# Altium footprint library Selex_PCBLib.PcbLib: 388 footprints (part 14 of 25)
Each footprint in its own frame and in the unit in brackets; x right, y up, seen from the top. Pads: shape width x height; smd on the part's side, far side on the other; paste and mask are expansions set on the pad; w line width, h text height; cw(c..) or ccw(c..) is an arc to the next point about the centre after c.
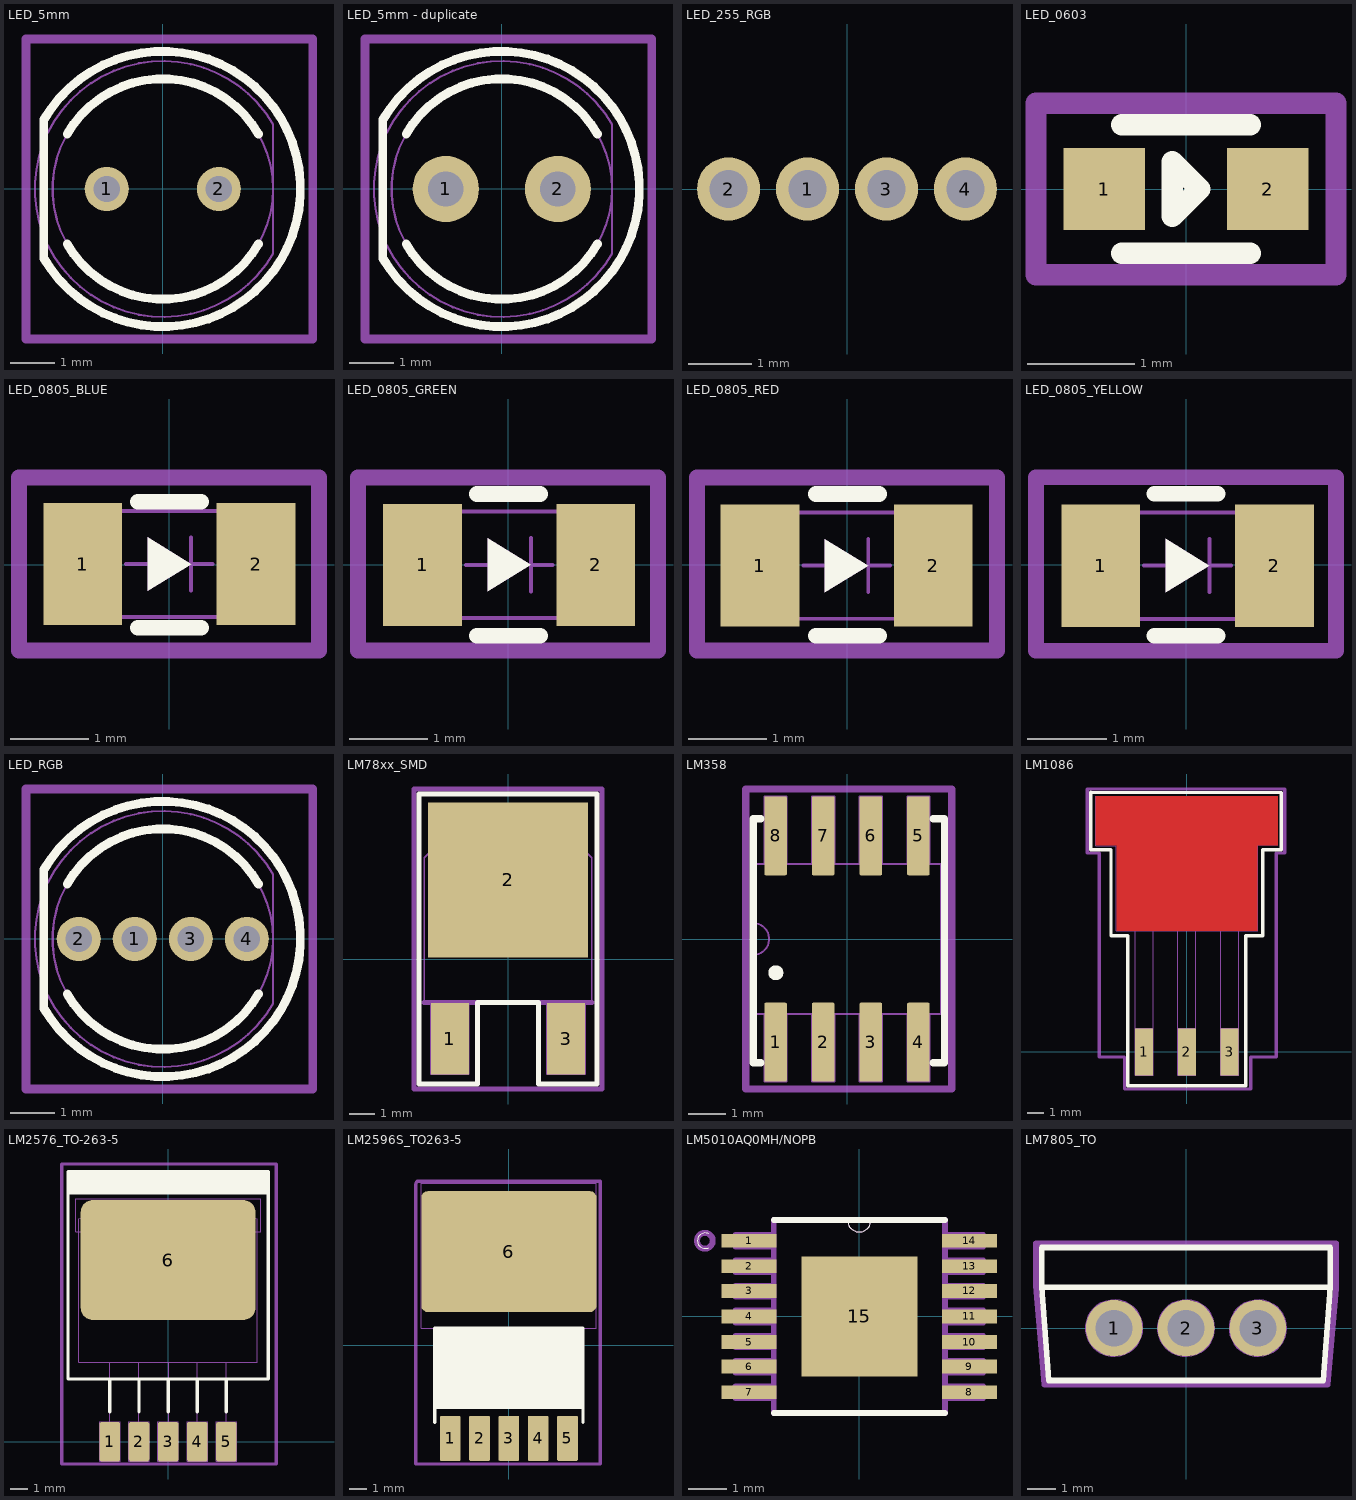
[diagram p13: the footprints below, top view; thin cyan lines are the x and y axes]

## LED_5mm [mm]
pads (2):
  round 1 hole 0.6: 1(-1.27,0) 2(1.27,0)
Top Overlay:
  lines w0.2: -2.7,-1.572 -2.7,1.572 ; -2.696,-1.57 ccw(c0,0) -2.696,1.57 ; -2.165,-1.25 ccw(c0,0) 2.165,-1.25 ; -2.165,1.25 cw(c0,0) 2.165,1.25
Mechanical 1:
  circle w0.05: c0,0 r2.5
  lines w0.05: 2.5,-1.47 cw(c0,0) 2.5,1.47 ; 2.5,-1.47 2.5,1.47
Mechanical 15:
  lines w0.2: -3.1,-3.4 -3.1,3.4 3.4,3.4 3.4,-3.4 -3.1,-3.4
3D body "ALSRobot-LED-RGB 5mm.step": height 9.85, standoff -2.85, extent -2.9,-2.9 2.5,2.9

## LED_5mm - duplicate [mm]
pads (2):
  round 1.5 hole 0.8: 1(-1.27,0) 2(1.27,0)
Top Overlay:
  lines w0.2: -2.7,-1.572 -2.7,1.572 ; -2.696,-1.57 ccw(c0,0) -2.696,1.57 ; -2.165,-1.25 ccw(c0,0) 2.165,-1.25 ; -2.165,1.25 cw(c0,0) 2.165,1.25
Mechanical 1:
  circle w0.05: c0,0 r2.5
  lines w0.05: 2.5,-1.47 cw(c0,0) 2.5,1.47 ; 2.5,-1.47 2.5,1.47
Mechanical 15:
  lines w0.2: -3.1,-3.4 3.4,-3.4 3.4,3.4 -3.1,3.4 -3.1,-3.4
3D body "ALSRobot-LED-RGB 5mm.step": height 9.85, standoff -2.85, extent -2.9,-2.9 2.5,2.9

## LED_255_RGB [mm]
pads (4):
  round 1 hole 0.6 mask+0.05: 1(-0.625,0) 2(-1.875,0) 3(0.625,0) 4(1.875,0)
Mechanical 1:
  text "R" at -2.01,-0.16 h0.3
  text "AN" at -0.93,-0.14 h0.3
  text "G" at 0.48,-0.13 h0.3
  text "B" at 1.77,-0.13 h0.3
3D body "ALSRobot-LED-RGB 5mm.sldprt": height 12.71, standoff 0.01, extent -2.5,-3 2.9,2.799

## LED_0603 [mil]
pads (2):
  rect 30x30 smd: 1(-30,0) 2(30,0)
Top Overlay:
  lines w7.87: -23.62,-23.62 23.62,-23.62 ; -23.62,23.62 23.62,23.62 ; -5,-10 -5,10 5,0 -5,-10
Mechanical 15:
  lines w7.87: -55.12,-31.5 55.12,-31.5 55.12,31.5 -55.12,31.5 -55.12,-31.5
3D body "User Library-LED_0603_R.STEP": height 23.62, standoff -0.08, extent -31.49,-15.74 31.5,15.75

## LED_0805_BLUE [mm]
pads (2):
  rect 1x1.55 smd mask+0.1: 1(-1.1,0.01) 2(1.1,0.01)
Top Overlay:
  region: -0.275,0.347 -0.275,-0.327 0.275,0.01
  lines w0.2: -0.4,-0.8 0.4,-0.8 ; -0.4,0.8 0.4,0.8
Mechanical 1:
  region: -0.275,0.347 -0.275,-0.327 0.275,0.01
  lines w0.05: -0.55,0.01 -0.275,0.01 ; 0.275,-0.327 0.275,0.347 ; 0.275,0.01 0.55,0.01 ; -1.1,-0.665 1.1,-0.665 1.1,0.685 -1.1,0.685 -1.1,-0.665
Mechanical 15:
  lines w0.2: -1.91,-1.09 1.9,-1.09 1.9,1.11 -1.91,1.11 -1.91,-1.09
3D body "LED0805BLUE.step": height 1.1, standoff 0, extent -0.96,-0.605 1.06,0.645

## LED_0805_GREEN [mm]
pads (2):
  rect 1x1.55 smd mask+0.1: 1(-1.09,0) 2(1.11,0)
Top Overlay:
  region: -0.265,0.338 -0.265,-0.337 0.285,0
  lines w0.2: -0.4,-0.9 0.4,-0.9 ; -0.4,0.9 0.4,0.9
Mechanical 1:
  region: -0.265,0.338 -0.265,-0.337 0.285,0
  lines w0.05: -0.54,0 -0.265,0 ; 0.285,-0.337 0.285,0.338 ; 0.285,0 0.56,0 ; -1.09,-0.675 1.11,-0.675 1.11,0.675 -1.09,0.675 -1.09,-0.675
Mechanical 15:
  lines w0.2: -1.91,-1.09 -1.91,1.11 1.9,1.11 1.9,-1.09 -1.91,-1.09
3D body "LED0805GREEN.step": height 1.1, standoff 0, extent -1.07,-0.625 0.95,0.625

## LED_0805_RED [mm]
pads (2):
  rect 1x1.55 smd mask+0.1: 1(-1.11,-0.01) 2(1.09,-0.01)
Top Overlay:
  region: -0.285,0.328 -0.285,-0.347 0.265,-0.01
  lines w0.2: -0.4,-0.9 0.4,-0.9 ; -0.4,0.9 0.4,0.9
Mechanical 1:
  region: -0.285,0.328 -0.285,-0.347 0.265,-0.01
  lines w0.05: -0.56,-0.01 -0.285,-0.01 ; 0.265,-0.347 0.265,0.328 ; 0.265,-0.01 0.54,-0.01 ; -1.11,-0.685 -1.11,0.665 1.09,0.665 1.09,-0.685 -1.11,-0.685
Mechanical 15:
  lines w0.2: -1.91,-1.09 1.9,-1.09 1.9,1.11 -1.91,1.11 -1.91,-1.09
3D body "LED0805RED.step": height 1.1, standoff 0, extent -1.05,-0.635 0.97,0.615

## LED_0805_YELLOW [mm]
pads (2):
  rect 1x1.55 smd mask+0.1: 1(-1.08,-0.01) 2(1.12,-0.01)
Top Overlay:
  region: -0.255,0.328 -0.255,-0.347 0.295,-0.01
  lines w0.2: -0.4,-0.9 0.4,-0.9 ; -0.4,0.9 0.4,0.9
Mechanical 1:
  region: -0.255,0.328 -0.255,-0.347 0.295,-0.01
  lines w0.05: -0.53,-0.01 -0.255,-0.01 ; 0.295,-0.347 0.295,0.328 ; 0.295,-0.01 0.57,-0.01 ; -1.08,-0.685 -1.08,0.665 1.12,0.665 1.12,-0.685 -1.08,-0.685
Mechanical 15:
  lines w0.2: -1.9,-1.09 -1.9,1.11 1.9,1.11 1.9,-1.09 -1.9,-1.09
3D body "LED0805YELLOW.step": height 1.1, standoff 0, extent -1,-0.635 1.02,0.615

## LED_RGB [mm]
pads (4):
  round 1 hole 0.6 unplated mask+0.05: 1(-0.635,0) 2(-1.905,0) 3(0.635,0) 4(1.905,0)
Top Overlay:
  lines w0.2: -2.7,-1.572 -2.7,1.572 ; -2.696,-1.57 ccw(c0,0) -2.696,1.57 ; -2.165,-1.25 ccw(c0,0) 2.165,-1.25 ; -2.165,1.25 cw(c0,0) 2.165,1.25
Mechanical 1:
  circle w0.05: c0,0 r2.5
  lines w0.05: 2.5,-1.47 cw(c0,0) 2.5,1.47 ; 2.5,-1.47 2.5,1.47
Mechanical 15:
  lines w0.2: -3.1,-3.4 3.4,-3.4 3.4,3.4 -3.1,3.4 -3.1,-3.4
3D body "ALSRobot-LED-RGB 5mm.step": height 9.85, standoff -2.85, extent -2.9,-2.9 2.5,2.9

## LM78xx_SMD [mm] "LM78xx Liner"
height 2.4
pads (3):
  rect 1.5x2.8 smd mask+0.1: 1(-2.286,-3.125) 3(2.286,-3.125)
  rect 6.3x6.1 smd mask+0.1: 2(0,3.125)
Top Overlay:
  lines w0.2: -3.5,-4.9 -3.5,6.5 3.5,6.5 3.5,-4.9 1.2,-4.9 1.2,-1.7 -1.2,-1.7 -1.2,-4.9 -3.5,-4.9
Mechanical 1:
  lines w0.05: -3.3,-1.7 -3.3,4 -2.8,4.5 2.8,4.5 3.3,4 3.3,-1.7 ; -3.04,-1.7 -3.04,-4.52 -1.54,-4.52 -1.54,-1.7 ; 1.52,-1.7 1.52,-4.52 3.04,-4.52 3.04,-1.7
  lines w0.2: -3.3,-1.7 3.3,-1.7
Mechanical 7:
  lines w0.2: -3.7,-5.1 3.7,-5.1 3.7,6.7 -3.7,6.7 -3.7,0.3 -3.7,-5.1
3D body "7805DPAK.step": height 2.3, standoff 0, extent -3.146,-3.85 3.347,5.65

## LM358 [mm] "LM358, SOP8"
height 1.75
pads (8):
  rrect10% 0.6x2.1 smd mask+0.07: 1(-1.905,-2.75) 2(-0.635,-2.75) 3(0.635,-2.75) 4(1.905,-2.75) 5(1.905,2.75) 6(0.635,2.75) 7(-0.635,2.75) 8(-1.905,2.75)
Top Overlay:
  circle w0.2: c-1.9,-0.9 r0.1
  lines w0.2: -2.3,-3.3 -2.5,-3.3 -2.5,3.2 -2.3,3.2 ; 2.3,-3.3 2.6,-3.3 2.6,3.2 2.3,3.2
Mechanical 1:
  lines w0.05: -2.205,-2 -2.205,-2.15 -2.205,-3.8 -1.605,-3.8 -1.605,-2 ; -2.205,2 -2.205,3.8 -1.605,3.8 -1.605,2.15 -1.605,2 ; -0.935,-2 -0.935,-2.15 -0.935,-3.8 -0.335,-3.8 -0.335,-2 ; -0.935,2 -0.935,3.8 -0.335,3.8 -0.335,2.15 -0.335,2 ; 0.335,-2 0.335,-2.15 0.335,-3.8 0.935,-3.8 0.935,-2 ; 0.335,2 0.335,3.8 0.935,3.8 0.935,2.15 0.935,2 ; 1.605,-2 1.605,-2.15 1.605,-3.8 2.205,-3.8 2.205,-2 ; 1.605,2 1.605,3.8 2.205,3.8 2.205,2.15 2.205,2 ; -2.5,-2 -2.5,-0.424 ccw(c-2.5,0) -2.5,0.424 -2.5,2 2.5,2 2.5,-2 -2.5,-2
  text "1" at -2,-1.4 h0.6
Mechanical 7:
  lines w0.2: -2.7,-4 -2.7,-1.4 -2.7,4 2.8,4 2.8,-4 -2.7,-4
3D body "User Library-HSOP8-1.STEP": height 1.74, standoff -0.01, extent -2.5,-3.1 2.5,3.1

## LM1086 [mm] "D2PAK"
height 4.64
pads (3):
  rect 1.07x2.78 smd: 1(-2.54,0) 2(0,0) 3(2.54,0)
Top Layer:
  region: -5.4,15.17 5.4,15.17 5.4,12.26 4.165,12.26 4.165,7.18 -4.165,7.18 -4.165,12.26 -5.4,12.26
Top Overlay:
  lines w0.2: -5.7,12 -4.5,12 -4.5,6.9 -3.5,6.9 -3.5,-2 3.5,-2 3.5,6.9 4.5,6.9 4.5,12 5.6,12 5.6,15.396 -5.7,15.403 -5.7,12
Mechanical 1:
  lines w0.05: -3.075,7.2 -3.075,1.39 ; -2.005,1.37 -2.005,7.18 ; -0.535,1.41 -0.535,7.2 ; 0.535,7.2 0.535,1.39 ; 2.005,1.41 2.005,7.2 ; 3.075,7.2 3.075,1.39 ; -3.075,1.39 -2.005,1.39 -2.005,-1.39 -3.075,-1.39 -3.075,1.39 ; 0.535,1.39 -0.535,1.39 -0.535,-1.39 0.535,-1.39 0.535,1.39 ; 3.075,1.39 2.005,1.39 2.005,-1.39 3.075,-1.39 3.075,1.39 ; -5.41,12.24 -4.2,12.24 -4.2,7.2 4.2,7.2 4.2,12.3 5.4,12.3 5.4,15.17 -5.41,15.17 -5.41,12.24
Mechanical 7:
  lines w0.2: -5.9,11.8 -5.9,15.6 5.8,15.6 5.8,11.8 5.3,11.8 5.3,-0.3 3.8,-0.3 3.8,-2.2 -3.7,-2.2 -3.7,-0.3 -5.2,-0.3 -5.2,11.5 -5.2,11.8 -5.9,11.8
3D body "LM1086.STEP": height 4.48, standoff -0.08, extent -5.06,-0.169 5.1,14.169

## LM2576_TO-263-5 [mm] "TO-263 -5  10.16x13.94, Pitch 1.7mm"
height 4.8
pads (6):
  rrect20% 1.2x2.3 smd paste+0 mask+0.05: 1(-3.4,0) 2(-1.7,0) 3(0,0) 4(1.7,0) 5(3.4,0)
  rrect20% 10.2x7 smd paste+0 mask+0.1: 6(0,10.6)
Top Overlay:
  rectangle: -5.842,14.433 5.842,15.748
  lines w0.2: -3.4,1.75 -3.4,3.66 ; -1.7,1.75 -1.7,3.66 ; 0,1.75 0,3.66 ; 1.7,1.75 1.7,3.66 ; 3.4,1.75 3.4,3.66 ; -5.842,3.66 -5.842,15.748 5.842,15.748 5.842,3.66 -5.842,3.66
Mechanical 1:
  lines w0.05: -3.4,1.15 -3.4,4.623 ; -1.7,1.15 -1.7,4.623 ; 0,1.15 0,4.623 ; 1.7,1.15 1.7,4.623 ; 3.4,1.15 3.4,4.623 ; -5.4,12.25 -5.4,14.17 5.4,14.17 5.4,12.25 5.205,12.25 4.15,12.25 4.15,7.2 -4.15,7.2 -4.15,12.25 -5.2,12.25 -5.4,12.25 ; -5.205,4.623 5.205,4.623 5.205,13.005 3.555,13.513 -3.555,13.513 -5.205,13.005 -5.205,11.863 -5.205,4.623 ; -4,-1.15 -2.8,-1.15 -2.8,1.15 -4,1.15 -4,-1.15 ; -2.3,-1.15 -2.3,1.15 -1.1,1.15 -1.1,-1.15 -2.3,-1.15 ; -0.6,-1.15 -0.6,1.15 0.6,1.15 0.6,-1.15 -0.6,-1.15 ; 1.1,-1.15 1.1,1.15 2.3,1.15 2.3,-1.15 1.1,-1.15 ; 2.8,-1.15 2.8,1.15 4,1.15 4,-1.15 2.8,-1.15
Mechanical 7:
  lines w0.2: -6.2,-1.3 -6.2,4 -6.2,16.2 6.3,16.2 6.3,-1.3 -6.2,-1.3
3D body "TO2635.STEP": height 4.56, standoff 0, extent -5.14,-0.357 5.02,13.658

## LM2596S_TO263-5 [mm] "TO263-5, SMD, 5V"
height 4.6
pads (6):
  rrect10% 1.2x2.6 smd mask+0.05: 1(-3.4,-5.415) 2(-1.7,-5.415) 3(0,-5.415) 4(1.7,-5.415) 5(3.4,-5.415)
  rrect10% 10.16x7 smd mask+0.05: 6(0,5.415)
Top Overlay:
  rectangle: -4.3,-3.625 4.3,0.97
  lines w0.2: -4.3,-4.49 -4.3,-3.625 4.3,-3.625 4.3,-4.49 ; -4.3,-3.825 -4.3,0.975 ; -4.3,0.97 4.3,0.97 4.3,-3.825
Mechanical 1:
  lines w0.05: -5.08,0.97 5.08,0.97 5.08,9.375 -5.08,9.375 -5.08,0.97
Mechanical 7:
  lines w0.2: -5.4,-6.9 5.3,-6.9 5.3,9.5 -5.3,9.5 ccw(c-5.059,9.259) -5.4,9.259 -5.4,-6.9
3D body "User Library-TO-263-1.step": height 4.65, standoff -0.18, extent -5.205,-5.914 5.205,8.455

## LM5010AQ0MH/NOPB [mil]
pads (15):
  rect 56x14 smd: 1(-112,77) 2(-112,51) 3(-112,26) 4(-112,0) 5(-112,-26) 6(-112,-51) 7(-112,-77) 8(112,-77) 9(112,-51) 10(112,-26) 11(112,0) 12(112,26) 13(112,51) 14(112,77)
  rect 118x122 smd: 15(0,0)
Top Overlay:
  lines w0: -153.06,69.97 cw(c-156.64,77) -153.06,84.03 ; -12,98 ccw(c0,98) 12,98
  lines w6: -87,-98 87,-98 ; -87,98 -12,98 12,98 87,98
Mechanical 13:
  lines w0: -12,98 ccw(c0,98) 12,98
  lines w6: -165,77 cw(c-157,77) -149,77 cw(c-157,77) -165,77 ; -126,-83 -87,-83 -87,-71 -126,-71 -126,-83 ; -126,-57 -87,-57 -87,-45 -126,-45 -126,-57 ; -126,-31 -87,-31 -87,-20 -126,-20 -126,-31 ; -126,-6 -87,-6 -87,6 -126,6 -126,-6 ; -126,20 -87,20 -87,31 -126,31 -126,20 ; -126,45 -87,45 -87,57 -126,57 -126,45 ; -126,71 -87,71 -87,83 -126,83 -126,71 ; -87,-98 -87,98 -12,98 12,98 87,98 87,-98 -87,-98 ; 87,-83 126,-83 126,-71 87,-71 87,-83 ; 87,-57 126,-57 126,-45 87,-45 87,-57 ; 87,-31 126,-31 126,-20 87,-20 87,-31 ; 87,-6 126,-6 126,6 87,6 87,-6 ; 87,20 126,20 126,31 87,31 87,20 ; 87,45 126,45 126,57 87,57 87,45 ; 87,71 126,71 126,83 87,83 87,71
3D body "NOPB.STEP": height 47.24, standoff 0, extent -125.98,-98.42 125.99,98.43

## LM7805_TO [mm] "POWER IC 7805"
height 15.49
pads (3):
  round 2 hole 1.3: 1(-2.54,0) 2(0,0) 3(2.54,0)
Top Overlay:
  lines w0.2: -5.1,1.451 -4.85,-1.85 4.85,-1.85 5.1,1.451 ; -5.1,1.45 5.1,1.45 5.1,2.85 -5.1,2.85 -5.1,1.45
Mechanical 1:
  circle w0.05: c2.54,0 r1
  circle w0.05: c0,0 r1
  circle w0.05: c-2.54,0 r1
  lines w0.05: -5.1,1.451 -4.85,-1.85 4.85,-1.85 5.1,1.451 ; -5.1,1.45 -5.1,2.85 5.1,2.85 5.1,1.45 -5.1,1.45
  text "O" at 2.159,1.524 h1.2
  text "G" at -0.381,1.524 h1.2
  text "I" at -2.667,1.524 h1.2
Mechanical 7:
  lines w0.2: -5.3,1.5 -5.3,3 5.3,3 5.3,1.4 5,-2 -5,-2 -5.3,1.5